# Altium footprint library XU-GENARAL PCB .PcbLib: 1176 footprints (part 49 of 75)
Each footprint in its own frame and in the unit in brackets; x right, y up, seen from the top. Pads: shape width x height; smd on the part's side, far side on the other; paste and mask are expansions set on the pad; w line width, h text height; cw(c..) or ccw(c..) is an arc to the next point about the centre after c.
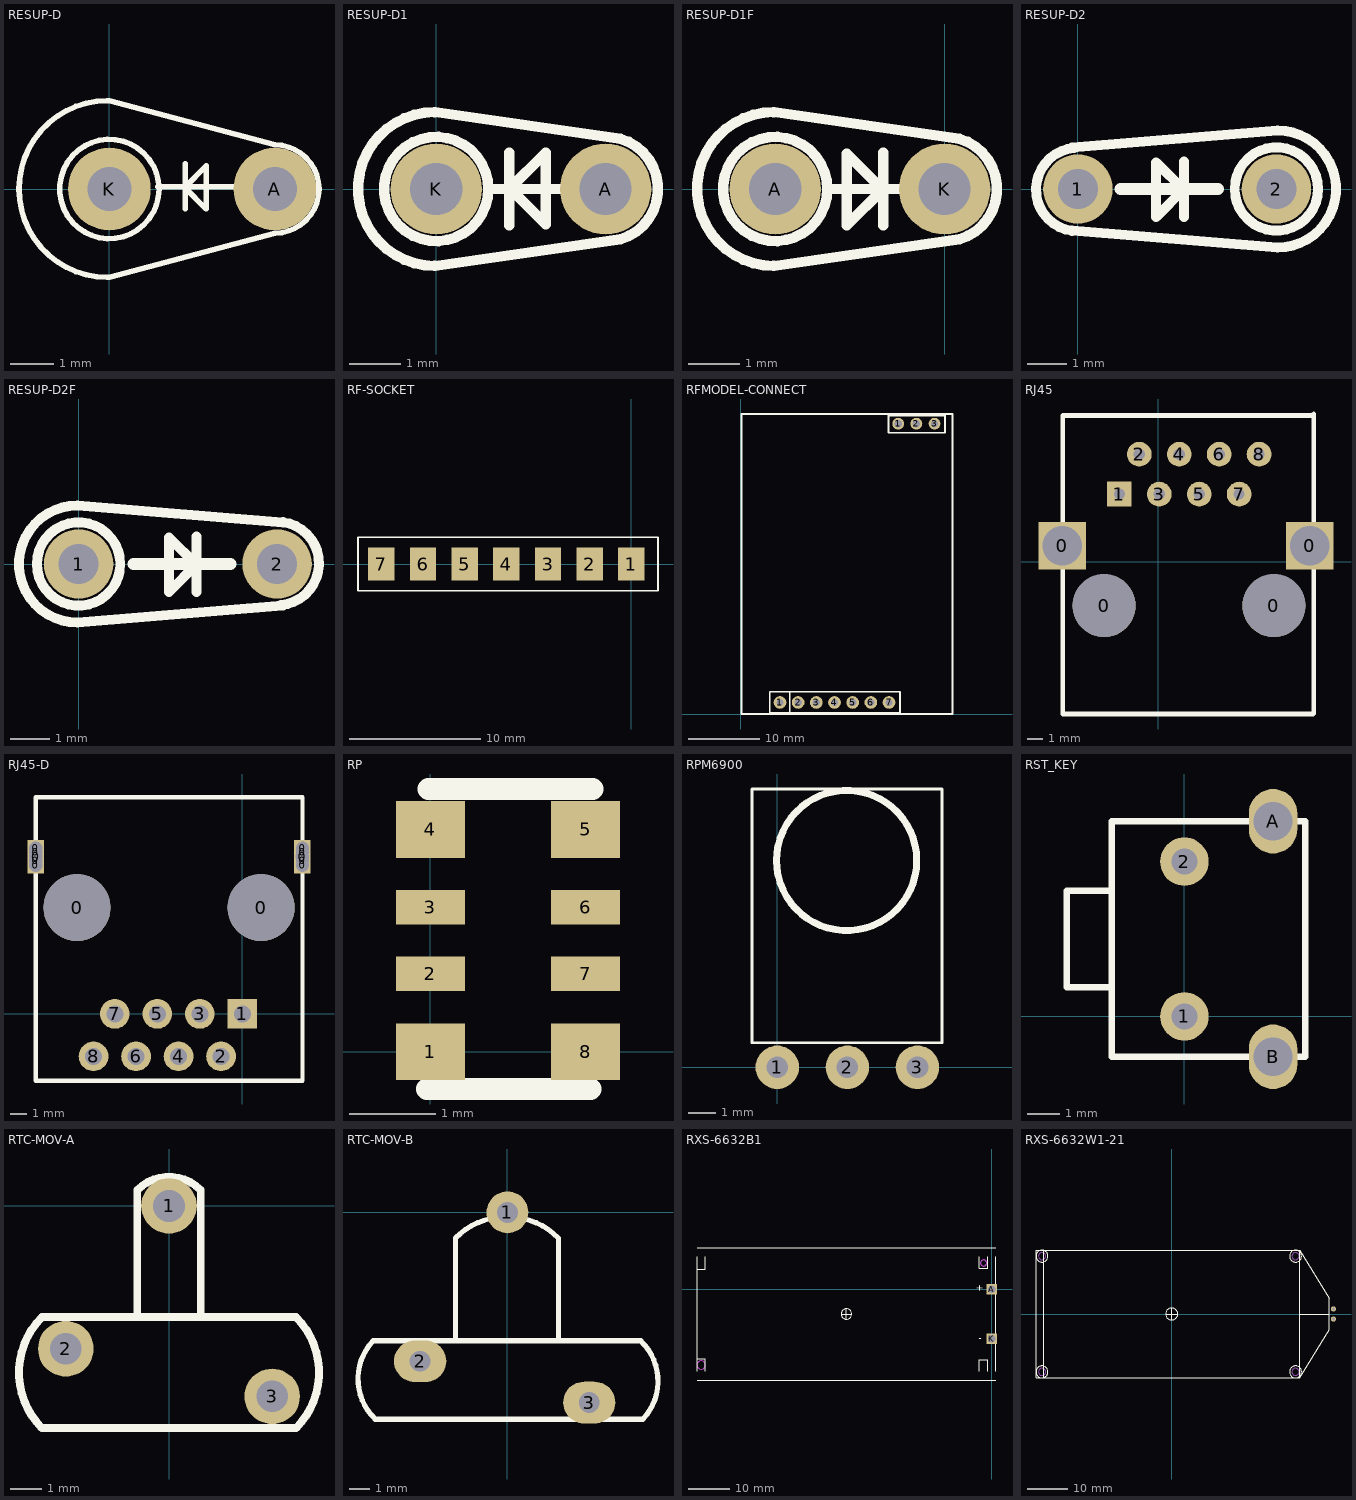
[diagram p48: the footprints below, top view; thin cyan lines are the x and y axes]

## RESUP-D [mil]
pads (2):
  round 75 hole 40: A(150,0) K(0,0)
Top Overlay:
  circle w5: c0,0 r45
  lines w5: -1.89,-80 cw(c-1.89,0) -1.89,80 ; 0,-80 150,-40 ccw(c150,0) 190,0 ccw(c150,0) 150,40 0,80 ; 43.76,1.96 114.76,1.96 ; 68.76,-18.04 68.76,22.96 ; 68.76,0.96 87.76,-18.04 87.76,20.96 68.76,1.96

## RESUP-D1 [mil]
pads (2):
  round 70 hole 40: A(130,0) K(0,0)
Top Overlay:
  circle w8: c0,0 r40
  lines w8: 40,0 99,0 ; 56,-28 56,28 ; 56,0 84,28 84,-27 56,1 ; -1,-59.05 cw(c-1,0) -1,59.05 141.17,38.58 cw(c130,0) 141.38,-38.52 -1,-59.05

## RESUP-D1F [mil]
pads (2):
  round 70 hole 40: A(-130,0) K(0,0)
Top Overlay:
  circle w8: c-130,0 r40
  lines w8: -90,0 -31,0 ; -47,-28 -47,28 ; -47,-1 -75,27 -75,-28 -47,0 ; -131,-59.05 cw(c-131,0) -131,59.05 11.17,38.58 cw(c0,0) 11.38,-38.52 -131,-59.05

## RESUP-D2 [mil]
pads (2):
  round 70 hole 40: 1(0,0) 2(200,0)
Top Overlay:
  circle w10: c200,0 r42
  lines w10: -6.1,-42.18 cw(c-0.26,-0.59) -3.92,41.25 ; -6,-42 201,-59 ; -6,42 201,59 ; 106.85,-28.15 106.85,27.85 ; 106.85,-1.15 78.85,26.85 78.85,-28.15 106.85,-0.15 ; 201,-59.05 ccw(c201,0) 201,59.05
  lines w12: 43,0 141,0

## RESUP-D2F [mil]
pads (2):
  round 70 hole 40: 1(0,0) 2(200,0)
Top Overlay:
  circle w10: c0,0 r42
  lines w10: -1,-59.05 cw(c-1,0) -1,59.05 ; -1,-59 206,-42 ; -1,59 206,42 ; 119,-28.15 119,27.85 ; 119,-1.15 91,26.85 91,-28.15 119,-0.15 ; 203.92,-41.25 ccw(c200.26,0.59) 206.1,42.18
  lines w12: 55.15,0 153.15,0

## RF-SOCKET [mm]
pads (7):
  rect 2x2.54 smd: 1(0,0) 2(-3.175,0) 3(-6.35,0) 4(-9.525,0) 5(-12.7,0) 6(-15.875,0) 7(-19.05,0)
Top Overlay:
  lines w0.127: -20.828,-2.032 -20.828,2.032 2.032,2.032 2.032,-2.032 -20.828,-2.032

## RFMODEL-CONNECT [mil]
pads (10):
  round 70 hole 40: 1(214.7,64.9) 2(314.7,64.9) 3(414.7,64.9) 4(514.7,64.9) 5(614.7,64.9) 6(714.7,64.9) 7(814.7,64.9)
  round 65 hole 40: 1(864.9,1597.8) 2(964.9,1597.8) 3(1064.9,1597.8)
Top Overlay:
  lines w10: 4.1,1651.2 4.1,1.3 1162.9,1.3 1162.9,1651.2 7.4,1651.2 ; 159.4,124 874.5,124 874.5,8.6 158.4,8.6 158.4,124 178.3,124 ; 268.2,8.6 268.2,124 269,124 ; 810.9,1604.9 810.9,1643.6 1121.9,1643.6 1121.9,1548.3 810.9,1548.3 810.9,1636.1

## RJ45 [mil]
pads (12):
  rect 118.11x118.11 hole 98.42: 0(-240,40) 0(380,40)
  round 157.48 hole 157.48: 0(-135,-110) 0(290,-110)
  rect 62x62 hole 28: 1(-96.89,169.37)
  round 62 hole 28: 2(-46.89,269.37) 3(3.11,169.37) 4(53.11,269.37) 5(103.11,169.37) 6(153.11,269.37) 7(203.11,169.37) 8(253.11,269.37)
Top Overlay:
  lines w12: 388.78,-381.22 352.52,-381.22 -188.03,-381.22 -238.78,-381.22 -238.78,366.22 -213.78,366.22 -187.64,366.22 353.11,366.22 386.22,366.22 388.78,368.78 ; 390,-380 390,370

## RJ45-D [mm]
pads (20):
  round 0.8 hole 0.8: 0(-12.35,8.89) 0(-12.35,9.144) 0(-12.35,9.652) 0(-12.35,9.906) 0(3.6,8.89) 0(3.6,9.144) 0(3.6,9.652) 0(3.6,9.906)
  rect 1x2 hole 0.8: 0(-12.345,9.4) 0(3.585,9.4)
  round 4 hole 4: 0(-9.875,6.35) 0(1.125,6.35)
  rect 1.778x1.778 hole 1.016: 1(0,0)
  round 1.778 hole 1.016: 2(-1.27,-2.54) 3(-2.54,0) 4(-3.81,-2.54) 5(-5.08,0) 6(-6.35,-2.54) 7(-7.62,0) 8(-8.89,-2.54)
Top Overlay:
  lines w0.254: -12.35,12.95 -12.35,-4 3.6,-4 3.6,12.95 ; -12.345,12.95 3.605,12.95

## RP [mm]
pads (8):
  rect 0.8x0.66 smd: 1(0,0) 4(0,2.579) 5(1.8,2.579) 8(1.8,0)
  rect 0.8x0.4 smd: 2(0,0.903) 3(0,1.676) 6(1.8,1.676) 7(1.8,0.903)
Top Overlay:
  lines w0.254: -0.041,-0.432 1.859,-0.432 ; -0.021,3.048 1.879,3.048

## RPM6900 [mil]
pads (3):
  round 62 hole 31: 1(0,0) 2(100,0) 3(200,0)
Top Overlay:
  circle w10: c99,295 r100
  lines w4: -36,35 235,35 235,397 -36,397 -36,35

## RST_KEY [mm]
pads (4):
  round 1.5 hole 0.8: 1(0,0) 2(0,4.8)
  oval 1.5x2 hole 1.2: A(2.75,6.05) B(2.75,-1.25)
Top Overlay:
  lines w0.2: -2.25,0.9 -3.65,0.9 -3.65,3.9 -2.25,3.9 ; -2.25,-1.25 3.75,-1.25 3.75,6.05 -2.25,6.05 -2.25,-1.25

## RTC-MOV-A [mil]
pads (3):
  round 70 hole 40: 1(0,0) 2(-130,-180) 3(130,-240)
Top Overlay:
  lines w10: -40,-140 -40,20 cw(c0,-20) 40,20 40,-140 ; -160,-280 cw(c-90,-210) -160,-140 160,-140 cw(c90,-210) 160,-280 -160,-280

## RTC-MOV-B [mil]
pads (3):
  round 80 hole 40: 1(0,0)
  oval 100x80 hole 40: 2(-167,-285) 3(156.48,-363.96)
Top Overlay:
  lines w10: -99.43,-245.85 -99.43,-49 cw(c-1,-147.43) 97.42,-49 97.42,-245.85 ; -256.91,-245.85 ccw(c-179.86,-318.8) -252.81,-395.85 259,-395.85 ccw(c181.95,-322.9) 254.9,-245.85 -256.91,-245.85

## RXS-6632B1 [mm]
pads (2):
  rect 2.5x2.5 hole 1.85: A(0,0) K(0,-12)
Top Overlay:
  circle w0.127: c-35.2,-6 r1.27
  lines w0.127: -71.4,-22 1,-22 ; -71.4,-19.85 -71.4,7.85 ; -71.4,-16.85 -69.4,-16.85 -69.4,-19.85 ; -71.4,4.85 -69.4,4.85 -69.4,7.85 ; -71.4,10 1,10 ; -36.47,-6 -35.2,-6 ; -35.2,-7.27 -35.2,-6 ; -35.2,-4.73 -35.2,-6 ; -33.93,-6 -35.2,-6 ; -3,-19.85 -3,-17.05 -1,-17.05 -1,-19.85 ; -3,7.85 -3,5.05 -1,5.05 -1,7.85 ; 1,-19.85 1,7.85
  text "+" at -2.172,-0.666 h1.52
  text "-" at -3.188,-12.604 h1.52
Keep-Out Layer:
  circle w0.127: c-70.4,-18.35 r1
  circle w0.127: c-2,6.35 r0.75
Mechanical 1:
  circle w0.127: c-70.4,-18.35 r1
  circle w0.127: c-2,6.35 r0.75

## RXS-6632W1-21 [mm]
pads (2):
  round 1.27 hole 0.8: A(40.5,1.27) K(40.5,-1.27)
Top Overlay:
  circle w0.127: c31,14.5 r1.5
  circle w0.127: c31,-14.5 r1.5
  circle w0.127: c-32.5,-14.5 r1.5
  circle w0.127: c-32.5,14.5 r1.5
  circle w0.127: c0,0 r1.5
  lines w0.127: -1.5,0 0,0 ; 0,-1.5 0,0 ; 0,1.5 0,0 ; 1.5,0 0,0 ; 32,0 39.5,0 ; -32,-16 -34,-16 -34,16 -32,16 ; -32,-16 32,-16 ; -32,-16 -32,16 ; -32,16 32,16 ; 32,-16 32,16 ; 32,-16 39.5,-4 39.5,0 ; 32,16 39.5,4 39.5,0
Mechanical 1:
  circle w0.127: c31,-14.5 r0.9
  circle w0.127: c31,14.5 r0.9
  circle w0.127: c-32.5,14.5 r0.9
  circle w0.127: c-32.5,-14.5 r0.9